# Altium footprint library IC.PcbLib: 386 footprints (part 26 of 30)
Each footprint in its own frame and in the unit in brackets; x right, y up, seen from the top. Pads: shape width x height; smd on the part's side, far side on the other; paste and mask are expansions set on the pad; w line width, h text height; cw(c..) or ccw(c..) is an arc to the next point about the centre after c.
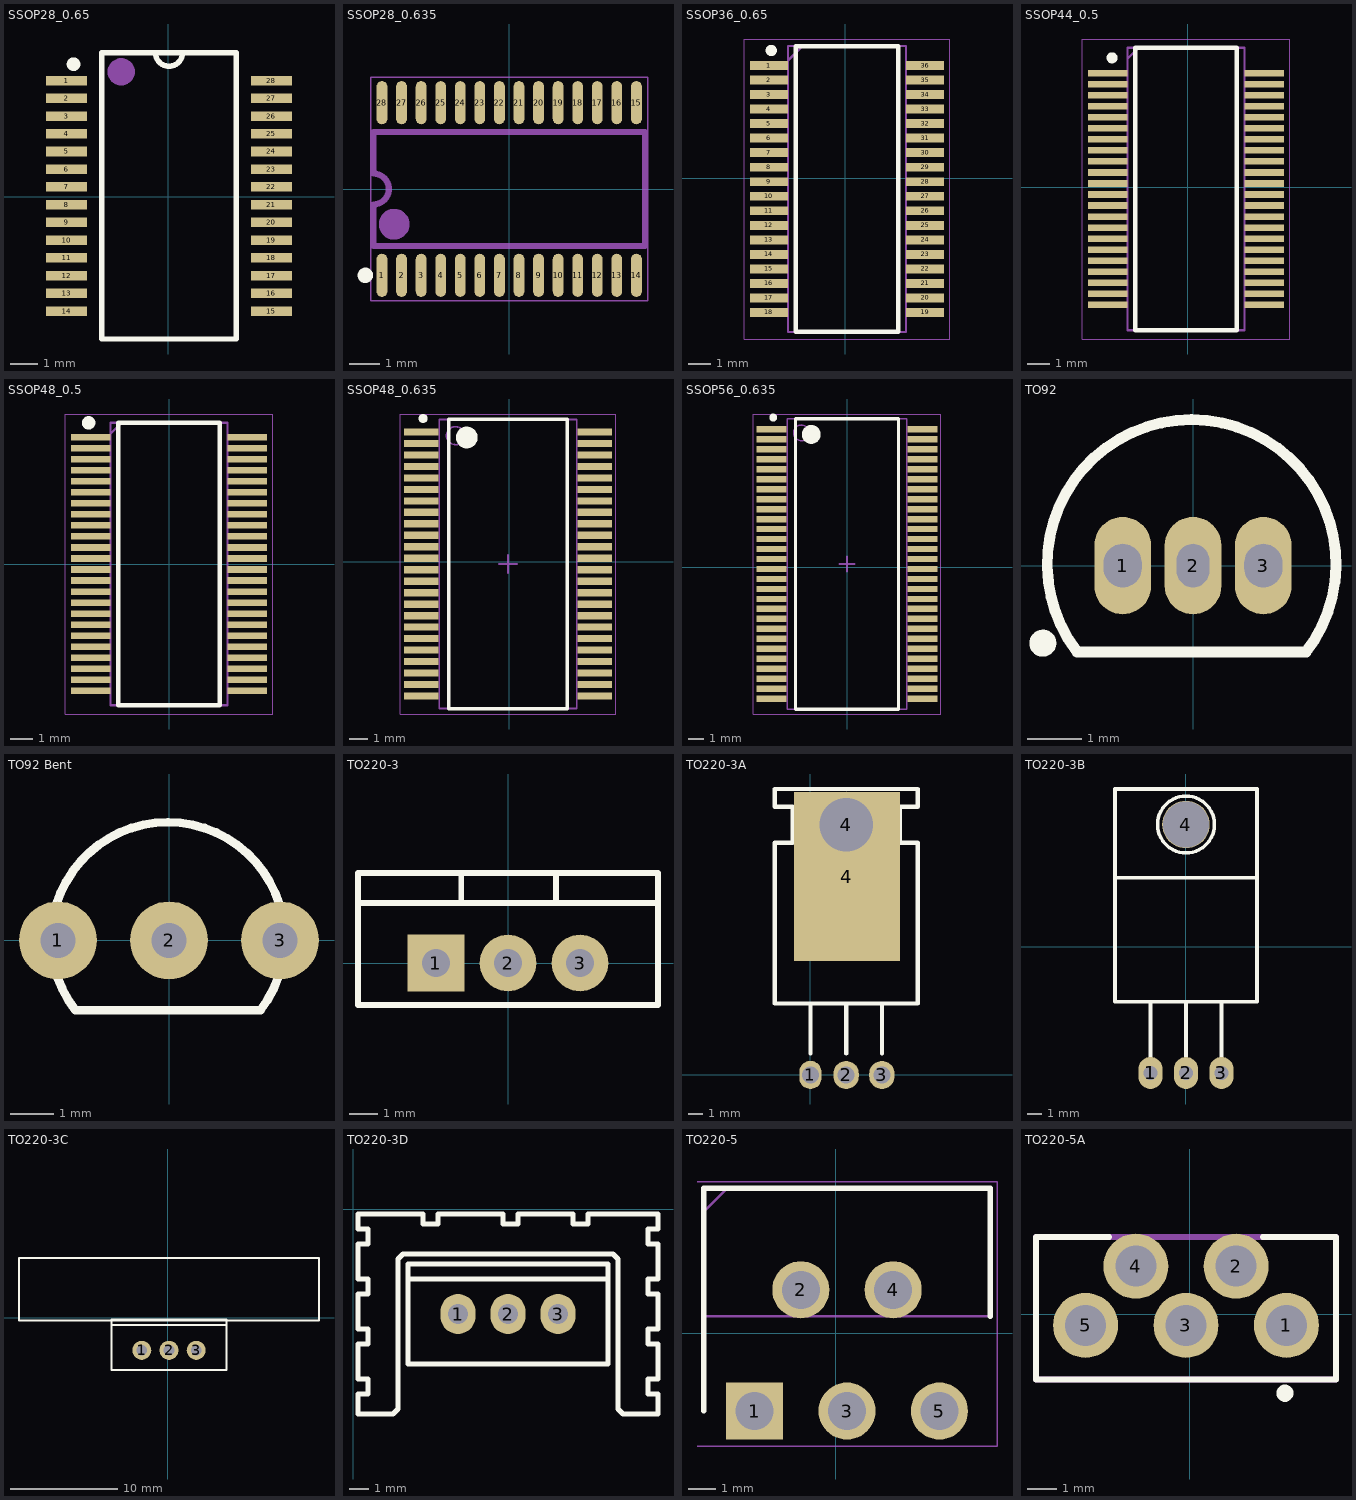
[diagram p25: the footprints below, top view; thin cyan lines are the x and y axes]

## SSOP28_0.65 [mm]
pads (28):
  rect 1.5x0.35 smd: 1(-3.729,4.25) 2(-3.729,3.6) 3(-3.729,2.95) 4(-3.729,2.3) 5(-3.729,1.65) 6(-3.729,1) 7(-3.729,0.35) 8(-3.729,-0.3) 9(-3.729,-0.95) 10(-3.729,-1.6) 11(-3.729,-2.25) 12(-3.729,-2.9) 13(-3.729,-3.55) 14(-3.729,-4.2) 15(3.779,-4.2) 16(3.779,-3.55) 17(3.779,-2.9) 18(3.779,-2.25) 19(3.779,-1.6) 20(3.779,-0.95) 21(3.779,-0.3) 22(3.779,0.35) 23(3.779,1) 24(3.779,1.65) 25(3.779,2.3) 26(3.779,2.95) 27(3.779,3.6) 28(3.779,4.25)
Top Overlay:
  circle w0.25: c-3.475,4.851 r0.125
  lines w0.2: -0.475,5.275 ccw(c0.025,5.275) 0.525,5.275 2.489,5.275 2.489,-5.225 -2.438,-5.225 -2.438,5.275 0.559,5.275
Mechanical 15:
  circle w0.6: c-1.727,4.572 r0.2
3D body "SSOP28-0.65.STEP": height 2.15, standoff 0, extent -3.852,-5.139 3.903,5.191

## SSOP28_0.635 [mm] "Shrink Small Outline; 16 Leads; Body Width 4.4 mm; Pitch 0.65 mm"
height 1.1
pads (28):
  oval 0.35x1.4 smd: 1(-4.127,-2.8) 2(-3.492,-2.8) 3(-2.857,-2.8) 4(-2.222,-2.8) 5(-1.587,-2.8) 6(-0.952,-2.8) 7(-0.317,-2.8) 8(0.318,-2.8) 9(0.953,-2.8) 10(1.588,-2.8) 11(2.223,-2.8) 12(2.858,-2.8) 13(3.493,-2.8) 14(4.128,-2.8) 15(4.128,2.8) 16(3.493,2.8) 17(2.858,2.8) 18(2.223,2.8) 19(1.588,2.8) 20(0.953,2.8) 21(0.318,2.8) 22(-0.317,2.8) 23(-0.952,2.8) 24(-1.587,2.8) 25(-2.222,2.8) 26(-2.857,2.8) 27(-3.492,2.8) 28(-4.127,2.8)
Top Overlay:
  circle w0.25: c-4.667,-2.8 r0.125
Mechanical 15:
  circle w0.6: c-3.732,-1.143 r0.2
  lines w0.05: -4.494,-3.632 4.496,-3.632 4.496,3.632 -4.494,3.632 -4.494,-3.632
  lines w0.2: -4.405,-1.85 4.405,-1.85 4.405,1.85 -4.405,1.85 -4.405,0.5 cw(c-4.405,0) -4.405,-0.5 -4.405,-1.85
3D body "SSOP16-0.635.STEP": height 1.1, standoff 0, extent -0.622,-2.997 4.356,2.997
3D body "SSOP16-0.635.STEP": height 1.1, standoff 0, extent -4.432,-2.997 0.546,2.997

## SSOP36_0.65 [mm]
pads (36):
  rect 1.705x0.4 smd: 1(-3.409,5.042) 2(-3.409,4.392) 3(-3.409,3.742) 4(-3.409,3.092) 5(-3.409,2.442) 6(-3.409,1.792) 7(-3.409,1.142) 8(-3.409,0.492) 9(-3.409,-0.158) 10(-3.409,-0.808) 11(-3.409,-1.458) 12(-3.409,-2.108) 13(-3.409,-2.758) 14(-3.409,-3.408) 15(-3.409,-4.058) 16(-3.409,-4.708) 17(-3.409,-5.358) 18(-3.409,-6.008) 19(3.587,-6.008) 20(3.587,-5.358) 21(3.587,-4.708) 22(3.587,-4.058) 23(3.587,-3.408) 24(3.587,-2.758) 25(3.587,-2.108) 26(3.587,-1.458) 27(3.587,-0.808) 28(3.587,-0.158) 29(3.587,0.492) 30(3.587,1.142) 31(3.587,1.792) 32(3.587,2.442) 33(3.587,3.092) 34(3.587,3.742) 35(3.587,4.392) 36(3.587,5.042)
Top Overlay:
  circle w0.25: c-3.302,5.72 r0.125
  lines w0.2: -2.206,-6.883 2.384,-6.883 2.384,5.917 -2.206,5.917 -2.206,-6.883
Mechanical 13:
  lines w0.1: -2.556,5.267 -1.906,5.917 ; -2.556,-6.883 2.734,-6.883 2.734,5.917 -2.556,5.917 -2.556,-6.883
Mechanical 15:
  lines w0.05: -4.511,-7.198 4.689,-7.198 4.689,6.232 -4.511,6.232 -4.511,-7.198
3D body "LTC1759CG#TR.stp": height 1.99, standoff 0, extent -3.799,-6.883 3.976,5.917

## SSOP44_0.5 [mm]
pads (44):
  rect 1.8x0.3 smd: 1(-3.626,5.174) 2(-3.626,4.674) 3(-3.626,4.174) 4(-3.626,3.674) 5(-3.626,3.174) 6(-3.626,2.674) 7(-3.626,2.174) 8(-3.626,1.674) 9(-3.626,1.174) 10(-3.626,0.674) 11(-3.626,0.174) 12(-3.626,-0.326) 13(-3.626,-0.826) 14(-3.626,-1.326) 15(-3.626,-1.826) 16(-3.626,-2.326) 17(-3.626,-2.826) 18(-3.626,-3.326) 19(-3.626,-3.826) 20(-3.626,-4.326) 21(-3.626,-4.826) 22(-3.626,-5.326) 23(3.474,-5.326) 24(3.474,-4.826) 25(3.474,-4.326) 26(3.474,-3.826) 27(3.474,-3.326) 28(3.474,-2.826) 29(3.474,-2.326) 30(3.474,-1.826) 31(3.474,-1.326) 32(3.474,-0.826) 33(3.474,-0.326) 34(3.474,0.174) 35(3.474,0.674) 36(3.474,1.174) 37(3.474,1.674) 38(3.474,2.174) 39(3.474,2.674) 40(3.474,3.174) 41(3.474,3.674) 42(3.474,4.174) 43(3.474,4.674) 44(3.474,5.174)
Top Overlay:
  circle w0.25: c-3.429,5.873 r0.125
  lines w0.2: -2.376,-6.476 -2.376,6.324 2.224,6.324 2.224,-6.476 -2.376,-6.476
Mechanical 13:
  lines w0.1: -2.726,5.824 -2.226,6.324 ; -2.726,-6.476 -2.726,6.324 2.574,6.324 2.574,-6.476 -2.726,-6.476
Mechanical 15:
  lines w0.05: -4.776,-6.876 -4.776,6.724 4.624,6.724 4.624,-6.876 -4.776,-6.876
3D body "LTC6803IG-2#PBF.stp": height 2, standoff 0, extent -3.976,-6.476 3.824,6.324

## SSOP48_0.5 [mm]
pads (48):
  rect 1.8x0.3 smd: 1(-3.55,5.75) 2(-3.55,5.25) 3(-3.55,4.75) 4(-3.55,4.25) 5(-3.55,3.75) 6(-3.55,3.25) 7(-3.55,2.75) 8(-3.55,2.25) 9(-3.55,1.75) 10(-3.55,1.25) 11(-3.55,0.75) 12(-3.55,0.25) 13(-3.55,-0.25) 14(-3.55,-0.75) 15(-3.55,-1.25) 16(-3.55,-1.75) 17(-3.55,-2.25) 18(-3.55,-2.75) 19(-3.55,-3.25) 20(-3.55,-3.75) 21(-3.55,-4.25) 22(-3.55,-4.75) 23(-3.55,-5.25) 24(-3.55,-5.75) 25(3.55,-5.75) 26(3.55,-5.25) 27(3.55,-4.75) 28(3.55,-4.25) 29(3.55,-3.75) 30(3.55,-3.25) 31(3.55,-2.75) 32(3.55,-2.25) 33(3.55,-1.75) 34(3.55,-1.25) 35(3.55,-0.75) 36(3.55,-0.25) 37(3.55,0.25) 38(3.55,0.75) 39(3.55,1.25) 40(3.55,1.75) 41(3.55,2.25) 42(3.55,2.75) 43(3.55,3.25) 44(3.55,3.75) 45(3.55,4.25) 46(3.55,4.75) 47(3.55,5.25) 48(3.55,5.75)
Top Overlay:
  circle w0.305: c-3.645,6.399 r0.152
  lines w0.2: -2.3,-6.4 2.3,-6.4 2.3,6.4 -2.3,6.4 -2.3,-6.4
Mechanical 13:
  lines w0.1: -2.65,5.9 -2.15,6.4 ; -2.65,-6.4 2.65,-6.4 2.65,6.4 -2.65,6.4 -2.65,-6.4
Mechanical 15:
  lines w0.05: -4.7,-6.8 4.7,-6.8 4.7,6.8 -4.7,6.8 -4.7,-6.8
3D body "LTC6804-2.stp": height 2, standoff 0, extent -3.9,-6.4 3.9,6.4

## SSOP48_0.635 [mm]
pads (48):
  rect 1.9x0.4 smd: 1(-4.878,7.175) 2(-4.878,6.54) 3(-4.878,5.905) 4(-4.878,5.271) 5(-4.878,4.635) 6(-4.878,4) 7(-4.878,3.365) 8(-4.878,2.73) 9(-4.878,2.095) 10(-4.878,1.46) 11(-4.878,0.826) 12(-4.878,0.191) 13(-4.878,-0.445) 14(-4.878,-1.079) 15(-4.878,-1.714) 16(-4.878,-2.349) 17(-4.878,-2.984) 18(-4.878,-3.619) 19(-4.878,-4.255) 20(-4.878,-4.889) 21(-4.878,-5.524) 22(-4.878,-6.159) 23(-4.878,-6.794) 24(-4.878,-7.429) 25(4.725,-7.429) 26(4.725,-6.794) 27(4.725,-6.159) 28(4.725,-5.524) 29(4.725,-4.889) 30(4.725,-4.255) 31(4.725,-3.619) 32(4.725,-2.984) 33(4.725,-2.349) 34(4.725,-1.714) 35(4.725,-1.079) 36(4.725,-0.445) 37(4.725,0.191) 38(4.725,0.826) 39(4.725,1.46) 40(4.725,2.095) 41(4.725,2.73) 42(4.725,3.365) 43(4.725,4) 44(4.725,4.635) 45(4.725,5.271) 46(4.725,5.905) 47(4.725,6.54) 48(4.725,7.175)
Top Overlay:
  circle w0.25: c-4.776,7.926 r0.125
  circle w0.6: c-2.351,6.873 r0.3
  lines w0.2: -3.351,-8.127 -3.351,7.873 3.199,7.873 3.199,-8.127 -3.351,-8.127
Mechanical 13:
  circle w0.1: c-2.976,6.973 r0.5
  lines w0.1: -3.876,-8.127 -3.876,7.873 3.724,7.873 3.724,-8.127 -3.876,-8.127
Mechanical 15:
  lines w0.05: -6.051,-8.427 -6.051,8.173 5.899,8.173 5.899,-8.427 -6.051,-8.427
  lines w0.1: -0.576,-0.127 0.424,-0.127 ; -0.076,-0.627 -0.076,0.373
3D body "SOP64P1010X265-48N.step": height 2.65, standoff 0, extent -5.152,-8.152 4.948,7.848

## SSOP56_0.635 [mm]
pads (56):
  rect 1.9x0.4 smd: 1(-4.802,8.776) 2(-4.802,8.141) 3(-4.802,7.506) 4(-4.802,6.871) 5(-4.802,6.236) 6(-4.802,5.601) 7(-4.802,4.966) 8(-4.802,4.331) 9(-4.802,3.696) 10(-4.802,3.061) 11(-4.802,2.426) 12(-4.802,1.791) 13(-4.802,1.156) 14(-4.802,0.521) 15(-4.802,-0.114) 16(-4.802,-0.749) 17(-4.802,-1.384) 18(-4.802,-2.019) 19(-4.802,-2.654) 20(-4.802,-3.289) 21(-4.802,-3.924) 22(-4.802,-4.559) 23(-4.802,-5.194) 24(-4.802,-5.829) 25(-4.802,-6.464) 26(-4.802,-7.099) 27(-4.802,-7.734) 28(-4.802,-8.369) 29(4.802,-8.369) 30(4.802,-7.734) 31(4.802,-7.099) 32(4.802,-6.464) 33(4.802,-5.829) 34(4.802,-5.194) 35(4.802,-4.559) 36(4.802,-3.924) 37(4.802,-3.289) 38(4.802,-2.654) 39(4.802,-2.019) 40(4.802,-1.384) 41(4.802,-0.749) 42(4.802,-0.114) 43(4.802,0.521) 44(4.802,1.156) 45(4.802,1.791) 46(4.802,2.426) 47(4.802,3.061) 48(4.802,3.696) 49(4.802,4.331) 50(4.802,4.966) 51(4.802,5.601) 52(4.802,6.236) 53(4.802,6.871) 54(4.802,7.506) 55(4.802,8.141) 56(4.802,8.776)
Top Overlay:
  circle w0.6: c-2.275,8.453 r0.3
  circle w0.25: c-4.7,9.526 r0.125
  lines w0.2: -3.275,-9.047 3.275,-9.047 3.275,9.453 -3.275,9.453 -3.275,-9.047
Mechanical 13:
  circle w0.1: c-2.9,8.553 r0.5
  lines w0.1: -3.8,-9.047 3.8,-9.047 3.8,9.453 -3.8,9.453 -3.8,-9.047
Mechanical 15:
  lines w0.05: -5.975,-9.347 5.975,-9.347 5.975,9.753 -5.975,9.753 -5.975,-9.347
  lines w0.1: -0.5,0.203 0.5,0.203 ; 0,-0.297 0,0.703
3D body "SOP64P1000X265-56N.step": height 2.65, standoff 0, extent -5.025,-9.051 4.975,9.449

## TO92 [mm]
pads (3):
  oval 1.05x1.8 hole 0.7 slot 0.8 at 90 deg: 1(-1.3,0) 3(1.3,0)
  oval 1.05x1.8 hole 0.6 slot 0.8 at 90 deg: 2(0,0)
Top Overlay:
  circle w0.25: c-2.779,-1.435 r0.125
  lines w0.2: -2.144,-1.6 2.093,-1.6 ; -2.144,-1.595 cw(c-0.025,0.03) 2.093,-1.595
3D body "TO92_Str.STEP": height 10, standoff -3, extent -2.613,-1.59 2.613,2.613

## TO92 Bent [mil]
pads (3):
  round 70 hole 31.5: 1(-100,0) 2(0,0) 3(100,0)
Top Overlay:
  lines w7.87: -84.4,-62.99 82.4,-62.99 ; -84.4,-62.81 cw(c-1,1.18) 82.4,-62.81
3D body "TO92 Bent.STEP": height 393.7, standoff -118.11, extent -109.83,-62.61 109.85,102.88

## TO220-3 [mm]
pads (3):
  rect 2x2 hole 1: 1(-2.54,0)
  round 2 hole 1: 2(0,0) 3(2.54,0)
Top Overlay:
  lines w0.2: -1.651,2.117 -1.651,3.175 ; 1.693,2.117 1.693,3.175 ; -5.292,2.117 -5.292,3.175 5.292,3.175 5.292,2.117 ; -5.292,2.117 -5.292,-1.482 5.292,-1.482 5.292,2.117 ; -5.292,2.117 5.292,2.117
3D body "TO-220 FULLPAK 3-PIN.STEP": height 19.37, standoff -10.1, extent -5.08,-1.667 5.08,3.033

## TO220-3A [mm]
pads (5):
  oval 1.575x2 hole 1.2: 1(0,0)
  oval 1.8x2 hole 1.2: 2(2.54,0) 3(5.08,0)
  round 4.7 hole 3.8: 4(2.54,17.78)
  rect 7.5x12 smd: 4(2.6,14.1)
Top Overlay:
  lines w0.305: 0,1.524 0,5.08 ; 2.54,1.524 2.54,5.08 ; 5.08,1.524 5.08,5.08 ; -2.54,5.08 -2.54,16.51 -1.27,16.51 -1.27,19.05 -2.54,19.05 -2.54,20.32 7.62,20.32 7.62,19.05 6.35,19.05 6.35,16.51 7.62,16.51 7.62,5.08 -2.54,5.08
3D body "TO220 L.STEP": height 4.5, standoff -3, extent -2.362,0.003 7.638,19.707

## TO220-3B [mm]
pads (4):
  oval 1.7x2.3 hole 1: 1(-2.539,-9.021) 2(0.001,-9.021) 3(2.541,-9.021)
  round 3.4 hole 3.3: 4(-0.003,8.758)
Top Overlay:
  circle w0.254: c0.001,8.759 r2.032
  lines w0.254: -5.077,4.951 5.081,4.951 ; -2.539,-9.021 -2.539,-3.941 ; 0.001,-9.021 0.001,-3.941 ; 2.541,-9.021 2.541,-3.941 ; -5.079,-3.941 -5.079,11.299 5.081,11.299 5.081,-3.941 -5.079,-3.941
3D body "TO220_L.STEP": height 4.5, standoff -3.7, extent -5.004,-9.039 4.996,10.665

## TO220-3C [mil]
pads (3):
  round 70 hole 39.37: 1(-95,-120) 2(5,-120) 3(105,-120)
Top Overlay:
  lines w7: -546.18,-9.8 -546.18,220 556.18,220 556.18,-9.8 -546.18,-9.8
  lines w7.87: -205.63,-27.48 215.63,-27.48 ; -205.63,-192.84 215.63,-192.84 215.63,-7.8 -205.63,-7.8 -205.63,-192.84
3D body: height 1181.1, standoff 393.7, extent -545,-9 555,217
3D body "TO-220 FULLPAK 3-PIN.STEP": height 1018.5, standoff -141.73, extent -194.99,-193.63 205.01,-8.59

## TO220-3D [mil]
pads (3):
  oval 70x80 hole 40: 1(210,-210) 2(310,-210) 3(410,-210)
Top Overlay:
  lines w10: 110,-140 510,-140 ; 10,-410 80,-410 90,-400 90,-100 100,-90 520,-90 530,-100 530,-400 540,-410 560,-410 610,-410 610,-370 590,-370 590,-340 610,-340 610,-270 590,-270 590,-240 610,-240 610,-170 590,-170 590,-140 610,-140 610,-70 590,-70 590,-40 610,-40 610,-10 470,-10 470,-30 440,-30 440,-10 330,-10 330,-30 300,-30 300,-10 170,-10 170,-30 140,-30 140,-10 10,-10 10,-40 30,-40 30,-70 10,-70 10,-140 30,-140 30,-170 10,-170 10,-240 30,-240 30,-270 10,-270 10,-340 30,-340 30,-370 10,-370 10,-410 ; 110,-310 510,-310 510,-110 110,-110 110,-310
3D body "To-220-6.STEP": height 826.77, standoff 39.37, extent 14.72,-404.7 605.28,-11
3D body "TO-220HS.STEP": height 808.74, standoff -71.26, extent 109,-265 509,-85

## TO220-5 [mm]
pads (5):
  rect 2.1x2.1 hole 1.4: 1(-2.992,-2.86)
  round 2.1 hole 1.4: 2(-1.292,1.6) 3(0.408,-2.86) 4(2.108,1.6) 5(3.808,-2.86)
Top Overlay:
  lines w0.2: -4.862,-2.86 -4.862,5.33 5.678,5.33 5.678,0.63
Mechanical 13:
  lines w0.1: -4.862,4.48 -4.012,5.33 ; -4.862,0.63 5.678,0.63 5.678,5.33 -4.862,5.33 -4.862,0.63
Mechanical 15:
  lines w0.05: -5.112,-4.16 5.928,-4.16 5.928,5.58 -5.112,5.58
3D body "LM2575HVT-5.0_LF03.stp": height 20.68, standoff -11.36, extent -4.734,-3.1 5.551,5.33

## TO220-5A [mm]
pads (5):
  round 2.2 hole 1.39: 1(3.269,-0.381) 2(1.569,1.619) 3(-0.131,-0.381) 4(-1.831,1.619) 5(-3.531,-0.381)
Top Overlay:
  circle w0.508: c3.22,-2.682 r0.035
  lines w0.2: -2.731,2.609 -5.211,2.609 -5.211,-2.221 4.949,-2.221 4.949,2.609 2.469,2.609
Mechanical 13:
  lines w0.2: -5.211,-2.221 4.949,-2.221 4.949,2.609 -5.211,2.609 -5.211,-2.221
3D body "LM2576-12WT.stp": height 17.61, standoff -6, extent -5.109,-2.094 5.051,2.606